# Altium footprint library Connector_PinHeader_2.54mm.PcbLib: 278 footprints (part 6 of 18) (continued)
## PinHeader_1x23_P2.54mm_Horizontal [mm] (continued)
F.CrtYd:
  lines w0.254: -1.8,-57.65 -1.8,1.8 10.55,1.8 10.55,-57.65 -1.8,-57.65
F.Fab:
  lines w0.254: 1.5,-56.2 -0.32,-56.2 -0.32,-55.56 1.5,-55.56 ; 1.5,-53.66 -0.32,-53.66 -0.32,-53.02 1.5,-53.02 ; 1.5,-51.12 -0.32,-51.12 -0.32,-50.48 1.5,-50.48 ; 1.5,-48.58 -0.32,-48.58 -0.32,-47.94 1.5,-47.94 ; 1.5,-46.04 -0.32,-46.04 -0.32,-45.4 1.5,-45.4 ; 1.5,-43.5 -0.32,-43.5 -0.32,-42.86 1.5,-42.86 ; 1.5,-40.96 -0.32,-40.96 -0.32,-40.32 1.5,-40.32 ; 1.5,-38.42 -0.32,-38.42 -0.32,-37.78 1.5,-37.78 ; 1.5,-35.88 -0.32,-35.88 -0.32,-35.24 1.5,-35.24 ; 1.5,-33.34 -0.32,-33.34 -0.32,-32.7 1.5,-32.7 ; 1.5,-30.8 -0.32,-30.8 -0.32,-30.16 1.5,-30.16 ; 1.5,-28.26 -0.32,-28.26 -0.32,-27.62 1.5,-27.62 ; 1.5,-25.72 -0.32,-25.72 -0.32,-25.08 1.5,-25.08 ; 1.5,-23.18 -0.32,-23.18 -0.32,-22.54 1.5,-22.54 ; 1.5,-20.64 -0.32,-20.64 -0.32,-20 1.5,-20 ; 1.5,-18.1 -0.32,-18.1 -0.32,-17.46 1.5,-17.46 ; 1.5,-15.56 -0.32,-15.56 -0.32,-14.92 1.5,-14.92 ; 1.5,-13.02 -0.32,-13.02 -0.32,-12.38 1.5,-12.38 ; 1.5,-10.48 -0.32,-10.48 -0.32,-9.84 1.5,-9.84 ; 1.5,-7.94 -0.32,-7.94 -0.32,-7.3 1.5,-7.3 ; 1.5,-5.4 -0.32,-5.4 -0.32,-4.76 1.5,-4.76 ; 1.5,-2.86 -0.32,-2.86 -0.32,-2.22 1.5,-2.22 ; 1.5,-0.32 -0.32,-0.32 -0.32,0.32 1.5,0.32 ; 4.04,-56.2 10.04,-56.2 10.04,-55.56 4.04,-55.56 ; 4.04,-53.66 10.04,-53.66 10.04,-53.02 4.04,-53.02 ; 4.04,-51.12 10.04,-51.12 10.04,-50.48 4.04,-50.48 ; 4.04,-48.58 10.04,-48.58 10.04,-47.94 4.04,-47.94 ; 4.04,-46.04 10.04,-46.04 10.04,-45.4 4.04,-45.4 ; 4.04,-43.5 10.04,-43.5 10.04,-42.86 4.04,-42.86 ; 4.04,-40.96 10.04,-40.96 10.04,-40.32 4.04,-40.32 ; 4.04,-38.42 10.04,-38.42 10.04,-37.78 4.04,-37.78 ; 4.04,-35.88 10.04,-35.88 10.04,-35.24 4.04,-35.24 ; 4.04,-33.34 10.04,-33.34 10.04,-32.7 4.04,-32.7 ; 4.04,-30.8 10.04,-30.8 10.04,-30.16 4.04,-30.16 ; 4.04,-28.26 10.04,-28.26 10.04,-27.62 4.04,-27.62 ; 4.04,-25.72 10.04,-25.72 10.04,-25.08 4.04,-25.08 ; 4.04,-23.18 10.04,-23.18 10.04,-22.54 4.04,-22.54 ; 4.04,-20.64 10.04,-20.64 10.04,-20 4.04,-20 ; 4.04,-18.1 10.04,-18.1 10.04,-17.46 4.04,-17.46 ; 4.04,-15.56 10.04,-15.56 10.04,-14.92 4.04,-14.92 ; 4.04,-13.02 10.04,-13.02 10.04,-12.38 4.04,-12.38 ; 4.04,-10.48 10.04,-10.48 10.04,-9.84 4.04,-9.84 ; 4.04,-7.94 10.04,-7.94 10.04,-7.3 4.04,-7.3 ; 4.04,-5.4 10.04,-5.4 10.04,-4.76 4.04,-4.76 ; 4.04,-2.86 10.04,-2.86 10.04,-2.22 4.04,-2.22 ; 4.04,-0.32 10.04,-0.32 10.04,0.32 4.04,0.32 ; 1.5,-57.15 1.5,0.635 2.135,1.27 4.04,1.27 4.04,-57.15 1.5,-57.15
  text "'.Designator'" at 3.61,-31.987 h1

## PinHeader_1x23_P2.54mm_Vertical [mm]
pads (23):
  rect 1.7x1.7 hole 1: 1(0,0)
  rrect100% 1.7x1.7 hole 1: 2(0,-2.54) 3(0,-5.08) 4(0,-7.62) 5(0,-10.16) 6(0,-12.7) 7(0,-15.24) 8(0,-17.78) 9(0,-20.32) 10(0,-22.86) 11(0,-25.4) 12(0,-27.94) 13(0,-30.48) 14(0,-33.02) 15(0,-35.56) 16(0,-38.1) 17(0,-40.64) 18(0,-43.18) 19(0,-45.72) 20(0,-48.26) 21(0,-50.8) 22(0,-53.34) 23(0,-55.88)
F.SilkS:
  lines w0.254: -1.33,0 -1.33,1.33 0,1.33 ; -1.33,-57.21 -1.33,-1.27 1.33,-1.27 1.33,-57.21 -1.33,-57.21
F.CrtYd:
  lines w0.254: -1.8,-57.65 -1.8,1.8 1.8,1.8 1.8,-57.65 -1.8,-57.65
F.Fab:
  lines w0.254: -1.27,-57.15 -1.27,0.635 -0.635,1.27 1.27,1.27 1.27,-57.15 -1.27,-57.15
  text "'.Designator'" at 0.84,-31.987 h1

## PinHeader_1x23_P2.54mm_Vertical_SMD_Pin1Left [mm]
pads (23):
  rect 2.51x1 smd: 1(-1.655,27.94) 2(1.655,25.4) 3(-1.655,22.86) 4(1.655,20.32) 5(-1.655,17.78) 6(1.655,15.24) 7(-1.655,12.7) 8(1.655,10.16) 9(-1.655,7.62) 10(1.655,5.08) 11(-1.655,2.54) 12(1.655,0) 13(-1.655,-2.54) 14(1.655,-5.08) 15(-1.655,-7.62) 16(1.655,-10.16) 17(-1.655,-12.7) 18(1.655,-15.24) 19(-1.655,-17.78) 20(1.655,-20.32) 21(-1.655,-22.86) 22(1.655,-25.4) 23(-1.655,-27.94)
F.SilkS:
  lines w0.254: -2.85,28.7 -1.33,28.7 -1.33,29.27 1.33,29.27 1.33,26.16 ; -1.33,-29.27 1.33,-29.27 ; -1.33,-27.18 -1.33,-23.62 ; -1.33,-22.1 -1.33,-18.54 ; -1.33,-17.02 -1.33,-13.46 ; -1.33,-11.94 -1.33,-8.38 ; -1.33,-6.86 -1.33,-3.3 ; -1.33,-1.78 -1.33,1.78 ; -1.33,3.3 -1.33,6.86 ; -1.33,8.38 -1.33,11.94 ; -1.33,13.46 -1.33,17.02 ; -1.33,18.54 -1.33,22.1 ; -1.33,23.62 -1.33,27.18 ; 1.33,-28.7 1.33,-29.27 ; 1.33,-26.16 1.33,-29.27 ; 1.33,-24.64 1.33,-21.08 ; 1.33,-19.56 1.33,-16 ; 1.33,-14.48 1.33,-10.92 ; 1.33,-9.4 1.33,-5.84 ; 1.33,-4.32 1.33,-0.76 ; 1.33,0.76 1.33,4.32 ; 1.33,5.84 1.33,9.4 ; 1.33,10.92 1.33,14.48 ; 1.33,16 1.33,19.56 ; 1.33,21.08 1.33,24.64
F.CrtYd:
  lines w0.254: -3.45,-29.75 -3.45,29.75 3.45,29.75 3.45,-29.75 -3.45,-29.75
F.Fab:
  lines w0.254: -1.27,-28.26 -2.54,-28.26 -2.54,-27.62 -1.27,-27.62 ; -1.27,-23.18 -2.54,-23.18 -2.54,-22.54 -1.27,-22.54 ; -1.27,-18.1 -2.54,-18.1 -2.54,-17.46 -1.27,-17.46 ; -1.27,-13.02 -2.54,-13.02 -2.54,-12.38 -1.27,-12.38 ; -1.27,-7.94 -2.54,-7.94 -2.54,-7.3 -1.27,-7.3 ; -1.27,-2.86 -2.54,-2.86 -2.54,-2.22 -1.27,-2.22 ; -1.27,2.22 -2.54,2.22 -2.54,2.86 -1.27,2.86 ; -1.27,7.3 -2.54,7.3 -2.54,7.94 -1.27,7.94 ; -1.27,12.38 -2.54,12.38 -2.54,13.02 -1.27,13.02 ; -1.27,17.46 -2.54,17.46 -2.54,18.1 -1.27,18.1 ; -1.27,22.54 -2.54,22.54 -2.54,23.18 -1.27,23.18 ; -1.27,27.62 -2.54,27.62 -2.54,28.26 -1.27,28.26 ; 1.27,-25.72 2.54,-25.72 2.54,-25.08 1.27,-25.08 ; 1.27,-20.64 2.54,-20.64 2.54,-20 1.27,-20 ; 1.27,-15.56 2.54,-15.56 2.54,-14.92 1.27,-14.92 ; 1.27,-10.48 2.54,-10.48 2.54,-9.84 1.27,-9.84 ; 1.27,-5.4 2.54,-5.4 2.54,-4.76 1.27,-4.76 ; 1.27,-0.32 2.54,-0.32 2.54,0.32 1.27,0.32 ; 1.27,4.76 2.54,4.76 2.54,5.4 1.27,5.4 ; 1.27,9.84 2.54,9.84 2.54,10.48 1.27,10.48 ; 1.27,14.92 2.54,14.92 2.54,15.56 1.27,15.56 ; 1.27,20 2.54,20 2.54,20.64 1.27,20.64 ; 1.27,25.08 2.54,25.08 2.54,25.72 1.27,25.72 ; -1.27,28.26 -0.32,29.21 1.27,29.21 1.27,-29.21 -1.27,-29.21 -1.27,28.26
  text "'.Designator'" at 0.84,-4.047 h1

## PinHeader_1x23_P2.54mm_Vertical_SMD_Pin1Right [mm]
pads (23):
  rect 2.51x1 smd: 1(1.655,27.94) 2(-1.655,25.4) 3(1.655,22.86) 4(-1.655,20.32) 5(1.655,17.78) 6(-1.655,15.24) 7(1.655,12.7) 8(-1.655,10.16) 9(1.655,7.62) 10(-1.655,5.08) 11(1.655,2.54) 12(-1.655,0) 13(1.655,-2.54) 14(-1.655,-5.08) 15(1.655,-7.62) 16(-1.655,-10.16) 17(1.655,-12.7) 18(-1.655,-15.24) 19(1.655,-17.78) 20(-1.655,-20.32) 21(1.655,-22.86) 22(-1.655,-25.4) 23(1.655,-27.94)
F.SilkS:
  lines w0.254: -1.33,-28.7 -1.33,-29.27 ; -1.33,-26.16 -1.33,-29.27 ; -1.33,-24.64 -1.33,-21.08 ; -1.33,-19.56 -1.33,-16 ; -1.33,-14.48 -1.33,-10.92 ; -1.33,-9.4 -1.33,-5.84 ; -1.33,-4.32 -1.33,-0.76 ; -1.33,0.76 -1.33,4.32 ; -1.33,5.84 -1.33,9.4 ; -1.33,10.92 -1.33,14.48 ; -1.33,16 -1.33,19.56 ; -1.33,21.08 -1.33,24.64 ; -1.33,26.16 -1.33,29.27 1.33,29.27 1.33,28.7 2.85,28.7 ; 1.33,-29.27 -1.33,-29.27 ; 1.33,-27.18 1.33,-23.62 ; 1.33,-22.1 1.33,-18.54 ; 1.33,-17.02 1.33,-13.46 ; 1.33,-11.94 1.33,-8.38 ; 1.33,-6.86 1.33,-3.3 ; 1.33,-1.78 1.33,1.78 ; 1.33,3.3 1.33,6.86 ; 1.33,8.38 1.33,11.94 ; 1.33,13.46 1.33,17.02 ; 1.33,18.54 1.33,22.1 ; 1.33,23.62 1.33,27.18
F.CrtYd:
  lines w0.254: -3.45,-29.75 -3.45,29.75 3.45,29.75 3.45,-29.75 -3.45,-29.75
F.Fab:
  lines w0.254: -1.27,-25.72 -2.54,-25.72 -2.54,-25.08 -1.27,-25.08 ; -1.27,-20.64 -2.54,-20.64 -2.54,-20 -1.27,-20 ; -1.27,-15.56 -2.54,-15.56 -2.54,-14.92 -1.27,-14.92 ; -1.27,-10.48 -2.54,-10.48 -2.54,-9.84 -1.27,-9.84 ; -1.27,-5.4 -2.54,-5.4 -2.54,-4.76 -1.27,-4.76 ; -1.27,-0.32 -2.54,-0.32 -2.54,0.32 -1.27,0.32 ; -1.27,4.76 -2.54,4.76 -2.54,5.4 -1.27,5.4 ; -1.27,9.84 -2.54,9.84 -2.54,10.48 -1.27,10.48 ; -1.27,14.92 -2.54,14.92 -2.54,15.56 -1.27,15.56 ; -1.27,20 -2.54,20 -2.54,20.64 -1.27,20.64 ; -1.27,25.08 -2.54,25.08 -2.54,25.72 -1.27,25.72 ; 1.27,-28.26 2.54,-28.26 2.54,-27.62 1.27,-27.62 ; 1.27,-23.18 2.54,-23.18 2.54,-22.54 1.27,-22.54 ; 1.27,-18.1 2.54,-18.1 2.54,-17.46 1.27,-17.46 ; 1.27,-13.02 2.54,-13.02 2.54,-12.38 1.27,-12.38 ; 1.27,-7.94 2.54,-7.94 2.54,-7.3 1.27,-7.3 ; 1.27,-2.86 2.54,-2.86 2.54,-2.22 1.27,-2.22 ; 1.27,2.22 2.54,2.22 2.54,2.86 1.27,2.86 ; 1.27,7.3 2.54,7.3 2.54,7.94 1.27,7.94 ; 1.27,12.38 2.54,12.38 2.54,13.02 1.27,13.02 ; 1.27,17.46 2.54,17.46 2.54,18.1 1.27,18.1 ; 1.27,22.54 2.54,22.54 2.54,23.18 1.27,23.18 ; 1.27,27.62 2.54,27.62 2.54,28.26 1.27,28.26 ; 1.27,28.26 0.32,29.21 -1.27,29.21 -1.27,-29.21 1.27,-29.21 1.27,28.26
  text "'.Designator'" at 0.84,-4.047 h1

## PinHeader_1x24_P2.54mm_Horizontal [mm]
pads (24):
  rect 1.7x1.7 hole 1: 1(0,0)
  rrect100% 1.7x1.7 hole 1: 2(0,-2.54) 3(0,-5.08) 4(0,-7.62) 5(0,-10.16) 6(0,-12.7) 7(0,-15.24) 8(0,-17.78) 9(0,-20.32) 10(0,-22.86) 11(0,-25.4) 12(0,-27.94) 13(0,-30.48) 14(0,-33.02) 15(0,-35.56) 16(0,-38.1) 17(0,-40.64) 18(0,-43.18) 19(0,-45.72) 20(0,-48.26) 21(0,-50.8) 22(0,-53.34) 23(0,-55.88) 24(0,-58.42)
F.SilkS:
  drawing of 155 lines, arcs and shapes, not listed
F.CrtYd:
  lines w0.254: -1.8,-60.2 -1.8,1.8 10.55,1.8 10.55,-60.2 -1.8,-60.2
F.Fab:
  lines w0.254: 1.5,-58.74 -0.32,-58.74 -0.32,-58.1 1.5,-58.1 ; 1.5,-56.2 -0.32,-56.2 -0.32,-55.56 1.5,-55.56 ; 1.5,-53.66 -0.32,-53.66 -0.32,-53.02 1.5,-53.02 ; 1.5,-51.12 -0.32,-51.12 -0.32,-50.48 1.5,-50.48 ; 1.5,-48.58 -0.32,-48.58 -0.32,-47.94 1.5,-47.94 ; 1.5,-46.04 -0.32,-46.04 -0.32,-45.4 1.5,-45.4 ; 1.5,-43.5 -0.32,-43.5 -0.32,-42.86 1.5,-42.86 ; 1.5,-40.96 -0.32,-40.96 -0.32,-40.32 1.5,-40.32 ; 1.5,-38.42 -0.32,-38.42 -0.32,-37.78 1.5,-37.78 ; 1.5,-35.88 -0.32,-35.88 -0.32,-35.24 1.5,-35.24 ; 1.5,-33.34 -0.32,-33.34 -0.32,-32.7 1.5,-32.7 ; 1.5,-30.8 -0.32,-30.8 -0.32,-30.16 1.5,-30.16 ; 1.5,-28.26 -0.32,-28.26 -0.32,-27.62 1.5,-27.62 ; 1.5,-25.72 -0.32,-25.72 -0.32,-25.08 1.5,-25.08 ; 1.5,-23.18 -0.32,-23.18 -0.32,-22.54 1.5,-22.54 ; 1.5,-20.64 -0.32,-20.64 -0.32,-20 1.5,-20 ; 1.5,-18.1 -0.32,-18.1 -0.32,-17.46 1.5,-17.46 ; 1.5,-15.56 -0.32,-15.56 -0.32,-14.92 1.5,-14.92 ; 1.5,-13.02 -0.32,-13.02 -0.32,-12.38 1.5,-12.38 ; 1.5,-10.48 -0.32,-10.48 -0.32,-9.84 1.5,-9.84 ; 1.5,-7.94 -0.32,-7.94 -0.32,-7.3 1.5,-7.3 ; 1.5,-5.4 -0.32,-5.4 -0.32,-4.76 1.5,-4.76 ; 1.5,-2.86 -0.32,-2.86 -0.32,-2.22 1.5,-2.22 ; 1.5,-0.32 -0.32,-0.32 -0.32,0.32 1.5,0.32 ; 4.04,-58.74 10.04,-58.74 10.04,-58.1 4.04,-58.1 ; 4.04,-56.2 10.04,-56.2 10.04,-55.56 4.04,-55.56 ; 4.04,-53.66 10.04,-53.66 10.04,-53.02 4.04,-53.02 ; 4.04,-51.12 10.04,-51.12 10.04,-50.48 4.04,-50.48 ; 4.04,-48.58 10.04,-48.58 10.04,-47.94 4.04,-47.94 ; 4.04,-46.04 10.04,-46.04 10.04,-45.4 4.04,-45.4 ; 4.04,-43.5 10.04,-43.5 10.04,-42.86 4.04,-42.86 ; 4.04,-40.96 10.04,-40.96 10.04,-40.32 4.04,-40.32 ; 4.04,-38.42 10.04,-38.42 10.04,-37.78 4.04,-37.78 ; 4.04,-35.88 10.04,-35.88 10.04,-35.24 4.04,-35.24 ; 4.04,-33.34 10.04,-33.34 10.04,-32.7 4.04,-32.7 ; 4.04,-30.8 10.04,-30.8 10.04,-30.16 4.04,-30.16 ; 4.04,-28.26 10.04,-28.26 10.04,-27.62 4.04,-27.62 ; 4.04,-25.72 10.04,-25.72 10.04,-25.08 4.04,-25.08 ; 4.04,-23.18 10.04,-23.18 10.04,-22.54 4.04,-22.54 ; 4.04,-20.64 10.04,-20.64 10.04,-20 4.04,-20 ; 4.04,-18.1 10.04,-18.1 10.04,-17.46 4.04,-17.46 ; 4.04,-15.56 10.04,-15.56 10.04,-14.92 4.04,-14.92 ; 4.04,-13.02 10.04,-13.02 10.04,-12.38 4.04,-12.38 ; 4.04,-10.48 10.04,-10.48 10.04,-9.84 4.04,-9.84 ; 4.04,-7.94 10.04,-7.94 10.04,-7.3 4.04,-7.3 ; 4.04,-5.4 10.04,-5.4 10.04,-4.76 4.04,-4.76 ; 4.04,-2.86 10.04,-2.86 10.04,-2.22 4.04,-2.22 ; 4.04,-0.32 10.04,-0.32 10.04,0.32 4.04,0.32 ; 1.5,-59.69 1.5,0.635 2.135,1.27 4.04,1.27 4.04,-59.69 1.5,-59.69
  text "'.Designator'" at 3.61,-33.257 h1

## PinHeader_1x24_P2.54mm_Vertical [mm]
pads (24):
  rect 1.7x1.7 hole 1: 1(0,0)
  rrect100% 1.7x1.7 hole 1: 2(0,-2.54) 3(0,-5.08) 4(0,-7.62) 5(0,-10.16) 6(0,-12.7) 7(0,-15.24) 8(0,-17.78) 9(0,-20.32) 10(0,-22.86) 11(0,-25.4) 12(0,-27.94) 13(0,-30.48) 14(0,-33.02) 15(0,-35.56) 16(0,-38.1) 17(0,-40.64) 18(0,-43.18) 19(0,-45.72) 20(0,-48.26) 21(0,-50.8) 22(0,-53.34) 23(0,-55.88) 24(0,-58.42)
F.SilkS:
  lines w0.254: -1.33,0 -1.33,1.33 0,1.33 ; -1.33,-59.75 -1.33,-1.27 1.33,-1.27 1.33,-59.75 -1.33,-59.75
F.CrtYd:
  lines w0.254: -1.8,-60.2 -1.8,1.8 1.8,1.8 1.8,-60.2 -1.8,-60.2
F.Fab:
  lines w0.254: -1.27,-59.69 -1.27,0.635 -0.635,1.27 1.27,1.27 1.27,-59.69 -1.27,-59.69
  text "'.Designator'" at 0.84,-33.257 h1

## PinHeader_1x24_P2.54mm_Vertical_SMD_Pin1Left [mm]
pads (24):
  rect 2.51x1 smd: 1(-1.655,29.21) 2(1.655,26.67) 3(-1.655,24.13) 4(1.655,21.59) 5(-1.655,19.05) 6(1.655,16.51) 7(-1.655,13.97) 8(1.655,11.43) 9(-1.655,8.89) 10(1.655,6.35) 11(-1.655,3.81) 12(1.655,1.27) 13(-1.655,-1.27) 14(1.655,-3.81) 15(-1.655,-6.35) 16(1.655,-8.89) 17(-1.655,-11.43) 18(1.655,-13.97) 19(-1.655,-16.51) 20(1.655,-19.05) 21(-1.655,-21.59) 22(1.655,-24.13) 23(-1.655,-26.67) 24(1.655,-29.21)
F.SilkS:
  lines w0.254: -2.85,29.97 -1.33,29.97 -1.33,30.54 1.33,30.54 1.33,27.43 ; -1.33,-27.43 -1.33,-30.54 1.33,-30.54 1.33,-29.97 ; -1.33,-25.91 -1.33,-22.35 ; -1.33,-20.83 -1.33,-17.27 ; -1.33,-15.75 -1.33,-12.19 ; -1.33,-10.67 -1.33,-7.11 ; -1.33,-5.59 -1.33,-2.03 ; -1.33,-0.51 -1.33,3.05 ; -1.33,4.57 -1.33,8.13 ; -1.33,9.65 -1.33,13.21 ; -1.33,14.73 -1.33,18.29 ; -1.33,19.81 -1.33,23.37 ; -1.33,24.89 -1.33,28.45 ; 1.33,-28.45 1.33,-24.89 ; 1.33,-23.37 1.33,-19.81 ; 1.33,-18.29 1.33,-14.73 ; 1.33,-13.21 1.33,-9.65 ; 1.33,-8.13 1.33,-4.57 ; 1.33,-3.05 1.33,0.51 ; 1.33,2.03 1.33,5.59 ; 1.33,7.11 1.33,10.67 ; 1.33,12.19 1.33,15.75 ; 1.33,17.27 1.33,20.83 ; 1.33,22.35 1.33,25.91
F.CrtYd:
  lines w0.254: -3.45,-31 -3.45,31 3.45,31 3.45,-31 -3.45,-31
F.Fab:
  lines w0.254: -1.27,-26.99 -2.54,-26.99 -2.54,-26.35 -1.27,-26.35 ; -1.27,-21.91 -2.54,-21.91 -2.54,-21.27 -1.27,-21.27 ; -1.27,-16.83 -2.54,-16.83 -2.54,-16.19 -1.27,-16.19 ; -1.27,-11.75 -2.54,-11.75 -2.54,-11.11 -1.27,-11.11 ; -1.27,-6.67 -2.54,-6.67 -2.54,-6.03 -1.27,-6.03 ; -1.27,-1.59 -2.54,-1.59 -2.54,-0.95 -1.27,-0.95 ; -1.27,3.49 -2.54,3.49 -2.54,4.13 -1.27,4.13 ; -1.27,8.57 -2.54,8.57 -2.54,9.21 -1.27,9.21 ; -1.27,13.65 -2.54,13.65 -2.54,14.29 -1.27,14.29 ; -1.27,18.73 -2.54,18.73 -2.54,19.37 -1.27,19.37 ; -1.27,23.81 -2.54,23.81 -2.54,24.45 -1.27,24.45 ; -1.27,28.89 -2.54,28.89 -2.54,29.53 -1.27,29.53 ; 1.27,-29.53 2.54,-29.53 2.54,-28.89 1.27,-28.89 ; 1.27,-24.45 2.54,-24.45 2.54,-23.81 1.27,-23.81 ; 1.27,-19.37 2.54,-19.37 2.54,-18.73 1.27,-18.73 ; 1.27,-14.29 2.54,-14.29 2.54,-13.65 1.27,-13.65 ; 1.27,-9.21 2.54,-9.21 2.54,-8.57 1.27,-8.57 ; 1.27,-4.13 2.54,-4.13 2.54,-3.49 1.27,-3.49 ; 1.27,0.95 2.54,0.95 2.54,1.59 1.27,1.59 ; 1.27,6.03 2.54,6.03 2.54,6.67 1.27,6.67 ; 1.27,11.11 2.54,11.11 2.54,11.75 1.27,11.75 ; 1.27,16.19 2.54,16.19 2.54,16.83 1.27,16.83 ; 1.27,21.27 2.54,21.27 2.54,21.91 1.27,21.91 ; 1.27,26.35 2.54,26.35 2.54,26.99 1.27,26.99 ; -1.27,29.53 -0.32,30.48 1.27,30.48 1.27,-30.48 -1.27,-30.48 -1.27,29.53
  text "'.Designator'" at 0.84,-4.047 h1

## PinHeader_1x24_P2.54mm_Vertical_SMD_Pin1Right [mm]
pads (24):
  rect 2.51x1 smd: 1(1.655,29.21) 2(-1.655,26.67) 3(1.655,24.13) 4(-1.655,21.59) 5(1.655,19.05) 6(-1.655,16.51) 7(1.655,13.97) 8(-1.655,11.43) 9(1.655,8.89) 10(-1.655,6.35) 11(1.655,3.81) 12(-1.655,1.27) 13(1.655,-1.27) 14(-1.655,-3.81) 15(1.655,-6.35) 16(-1.655,-8.89) 17(1.655,-11.43) 18(-1.655,-13.97) 19(1.655,-16.51) 20(-1.655,-19.05) 21(1.655,-21.59) 22(-1.655,-24.13) 23(1.655,-26.67) 24(-1.655,-29.21)
F.SilkS:
  lines w0.254: -1.33,-29.97 -1.33,-30.54 1.33,-30.54 1.33,-27.43 ; -1.33,-28.45 -1.33,-24.89 ; -1.33,-23.37 -1.33,-19.81 ; -1.33,-18.29 -1.33,-14.73 ; -1.33,-13.21 -1.33,-9.65 ; -1.33,-8.13 -1.33,-4.57 ; -1.33,-3.05 -1.33,0.51 ; -1.33,2.03 -1.33,5.59 ; -1.33,7.11 -1.33,10.67 ; -1.33,12.19 -1.33,15.75 ; -1.33,17.27 -1.33,20.83 ; -1.33,22.35 -1.33,25.91 ; -1.33,27.43 -1.33,30.54 1.33,30.54 1.33,29.97 2.85,29.97 ; 1.33,-25.91 1.33,-22.35 ; 1.33,-20.83 1.33,-17.27 ; 1.33,-15.75 1.33,-12.19 ; 1.33,-10.67 1.33,-7.11 ; 1.33,-5.59 1.33,-2.03 ; 1.33,-0.51 1.33,3.05 ; 1.33,4.57 1.33,8.13 ; 1.33,9.65 1.33,13.21 ; 1.33,14.73 1.33,18.29 ; 1.33,19.81 1.33,23.37 ; 1.33,24.89 1.33,28.45
F.CrtYd:
  lines w0.254: -3.45,-31 -3.45,31 3.45,31 3.45,-31 -3.45,-31
F.Fab:
  lines w0.254: -1.27,-29.53 -2.54,-29.53 -2.54,-28.89 -1.27,-28.89 ; -1.27,-24.45 -2.54,-24.45 -2.54,-23.81 -1.27,-23.81 ; -1.27,-19.37 -2.54,-19.37 -2.54,-18.73 -1.27,-18.73 ; -1.27,-14.29 -2.54,-14.29 -2.54,-13.65 -1.27,-13.65 ; -1.27,-9.21 -2.54,-9.21 -2.54,-8.57 -1.27,-8.57 ; -1.27,-4.13 -2.54,-4.13 -2.54,-3.49 -1.27,-3.49 ; -1.27,0.95 -2.54,0.95 -2.54,1.59 -1.27,1.59 ; -1.27,6.03 -2.54,6.03 -2.54,6.67 -1.27,6.67 ; -1.27,11.11 -2.54,11.11 -2.54,11.75 -1.27,11.75 ; -1.27,16.19 -2.54,16.19 -2.54,16.83 -1.27,16.83 ; -1.27,21.27 -2.54,21.27 -2.54,21.91 -1.27,21.91 ; -1.27,26.35 -2.54,26.35 -2.54,26.99 -1.27,26.99 ; 1.27,-26.99 2.54,-26.99 2.54,-26.35 1.27,-26.35 ; 1.27,-21.91 2.54,-21.91 2.54,-21.27 1.27,-21.27 ; 1.27,-16.83 2.54,-16.83 2.54,-16.19 1.27,-16.19 ; 1.27,-11.75 2.54,-11.75 2.54,-11.11 1.27,-11.11 ; 1.27,-6.67 2.54,-6.67 2.54,-6.03 1.27,-6.03 ; 1.27,-1.59 2.54,-1.59 2.54,-0.95 1.27,-0.95 ; 1.27,3.49 2.54,3.49 2.54,4.13 1.27,4.13 ; 1.27,8.57 2.54,8.57 2.54,9.21 1.27,9.21 ; 1.27,13.65 2.54,13.65 2.54,14.29 1.27,14.29 ; 1.27,18.73 2.54,18.73 2.54,19.37 1.27,19.37 ; 1.27,23.81 2.54,23.81 2.54,24.45 1.27,24.45 ; 1.27,28.89 2.54,28.89 2.54,29.53 1.27,29.53 ; 1.27,29.53 0.32,30.48 -1.27,30.48 -1.27,-30.48 1.27,-30.48 1.27,29.53
  text "'.Designator'" at 0.84,-4.047 h1

## PinHeader_1x25_P2.54mm_Horizontal [mm]
pads (25):
  rect 1.7x1.7 hole 1: 1(0,0)
  rrect100% 1.7x1.7 hole 1: 2(0,-2.54) 3(0,-5.08) 4(0,-7.62) 5(0,-10.16) 6(0,-12.7) 7(0,-15.24) 8(0,-17.78) 9(0,-20.32) 10(0,-22.86) 11(0,-25.4) 12(0,-27.94) 13(0,-30.48) 14(0,-33.02) 15(0,-35.56) 16(0,-38.1) 17(0,-40.64) 18(0,-43.18) 19(0,-45.72) 20(0,-48.26) 21(0,-50.8) 22(0,-53.34) 23(0,-55.88) 24(0,-58.42) 25(0,-60.96)
F.SilkS:
  drawing of 161 lines, arcs and shapes, not listed
F.CrtYd:
  lines w0.254: -1.8,-62.75 -1.8,1.8 10.55,1.8 10.55,-62.75 -1.8,-62.75
F.Fab:
  drawing of 155 lines, arcs and shapes, not listed
  text "'.Designator'" at 3.61,-34.527 h1

## PinHeader_1x25_P2.54mm_Vertical [mm]
pads (25):
  rect 1.7x1.7 hole 1: 1(0,0)
  rrect100% 1.7x1.7 hole 1: 2(0,-2.54) 3(0,-5.08) 4(0,-7.62) 5(0,-10.16) 6(0,-12.7) 7(0,-15.24) 8(0,-17.78) 9(0,-20.32) 10(0,-22.86) 11(0,-25.4) 12(0,-27.94) 13(0,-30.48) 14(0,-33.02) 15(0,-35.56) 16(0,-38.1) 17(0,-40.64) 18(0,-43.18) 19(0,-45.72) 20(0,-48.26) 21(0,-50.8) 22(0,-53.34) 23(0,-55.88) 24(0,-58.42) 25(0,-60.96)
F.SilkS:
  lines w0.254: -1.33,0 -1.33,1.33 0,1.33 ; -1.33,-62.29 -1.33,-1.27 1.33,-1.27 1.33,-62.29 -1.33,-62.29
F.CrtYd:
  lines w0.254: -1.8,-62.75 -1.8,1.8 1.8,1.8 1.8,-62.75 -1.8,-62.75
F.Fab:
  lines w0.254: -1.27,-62.23 -1.27,0.635 -0.635,1.27 1.27,1.27 1.27,-62.23 -1.27,-62.23
  text "'.Designator'" at 0.84,-34.527 h1